# Altium footprint library 04.连接器件.pcb.PCBLIB: 363 footprints (part 11 of 23)
Each footprint in its own frame and in the unit in brackets; x right, y up, seen from the top. Pads: shape width x height; smd on the part's side, far side on the other; paste and mask are expansions set on the pad; w line width, h text height; cw(c..) or ccw(c..) is an arc to the next point about the centre after c.
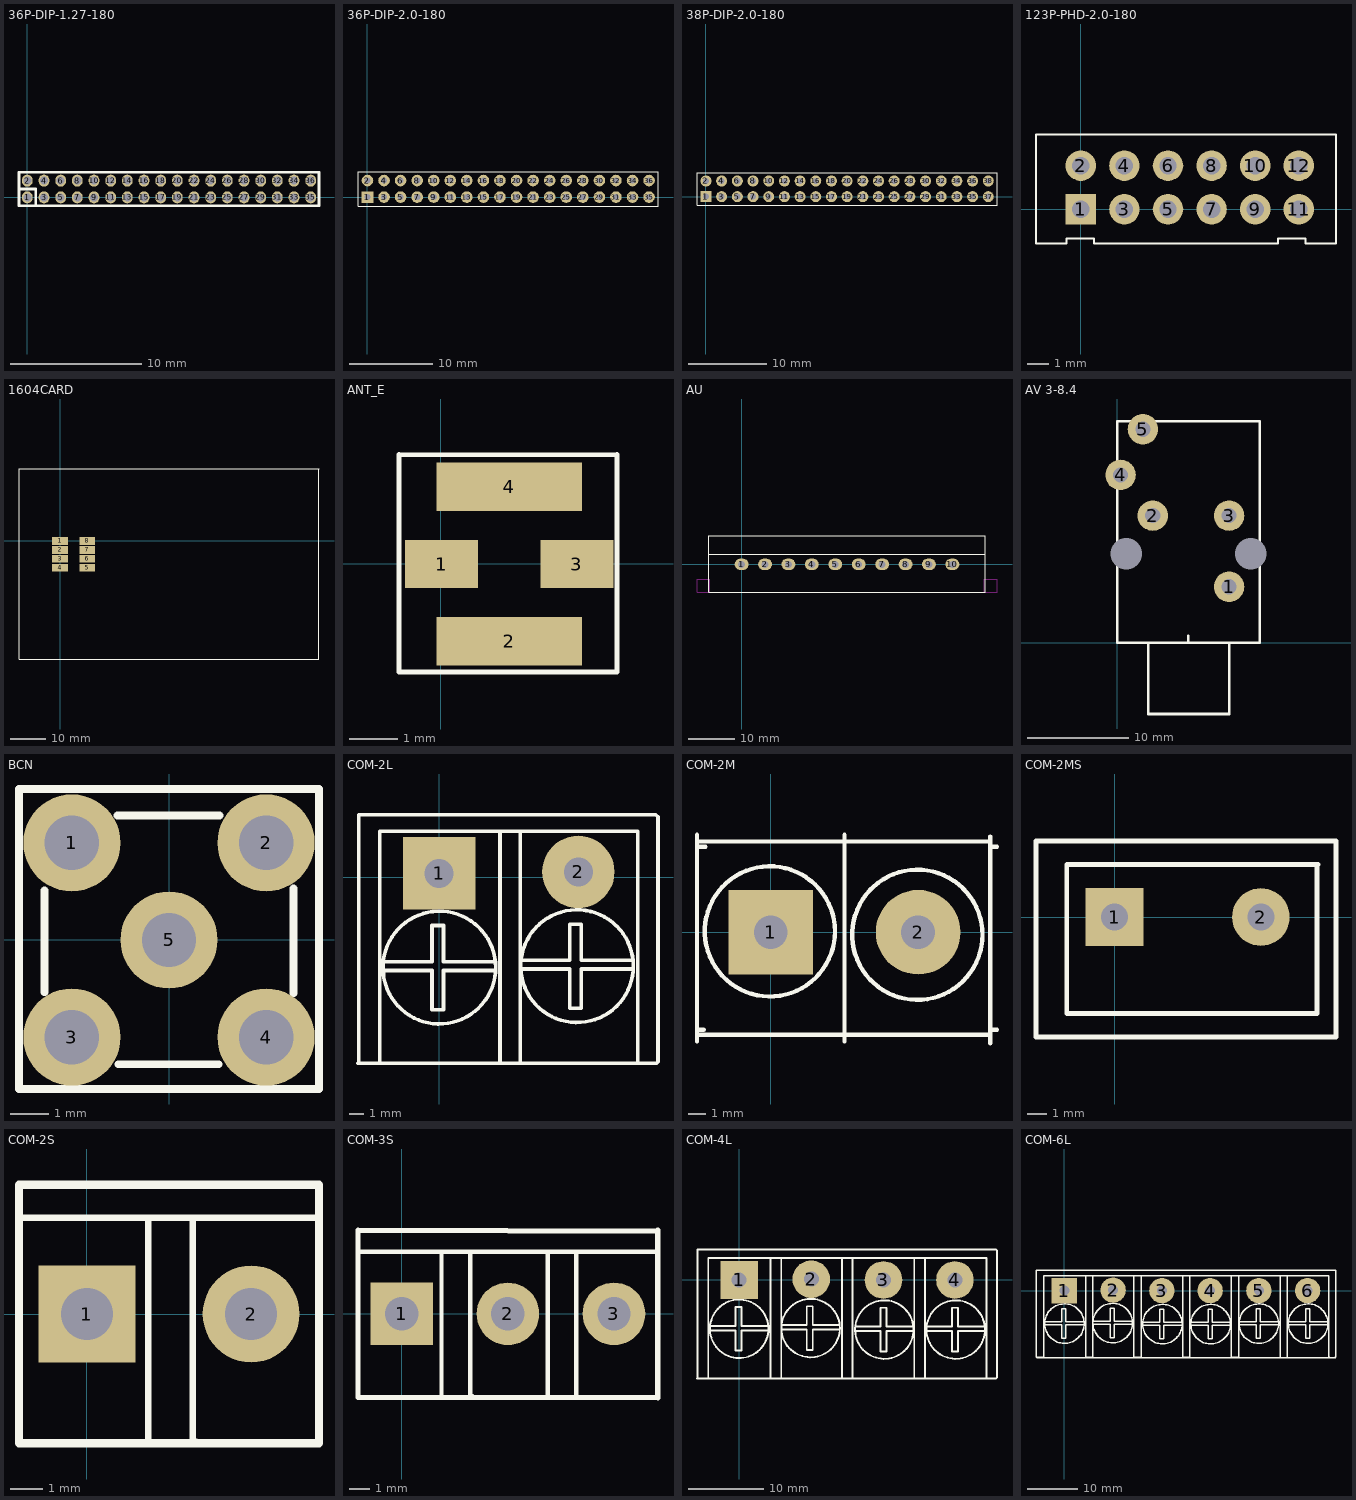
[diagram p10: the footprints below, top view; thin cyan lines are the x and y axes]

## 36P-DIP-1.27-180 [mil]
pads (36):
  oval 32x36 hole 24: 1(0,0) 2(0,50) 3(50,0) 4(50,50) 5(100,0) 6(100,50) 7(150,0) 8(150,50) 9(200,0) 10(200,50) 11(250,0) 12(250,50) 13(300,0) 14(300,50) 15(350,0) 16(350,50) 17(400,0) 18(400,50) 19(450,0) 20(450,50) 21(500,0) 22(500,50) 23(550,0) 24(550,50) 25(600,0) 26(600,50) 27(650,0) 28(650,50) 29(700,0) 30(700,50) 31(750,0) 32(750,50) 33(800,0) 34(800,50) 35(850,0) 36(850,50)
TopOverlay:
  lines w8: -25,25 25,25 25,-25 ; -25,-25 875,-25 875,75 -25,75 -25,-25

## 36P-DIP-2.0-180 [mm]
pads (36):
  rect 1.4x1.4 hole 0.75: 1(0,0)
  round 1.4 hole 0.75: 2(0,2) 3(2,0) 4(2,2) 5(4,0) 6(4,2) 7(6,0) 8(6,2) 9(8,0) 10(8,2) 11(10,0) 12(10,2) 13(12,0) 14(12,2) 15(14,0) 16(14,2) 17(16,0) 18(16,2) 19(18,0) 20(18,2) 21(20,0) 22(20,2) 23(22,0) 24(22,2) 25(24,0) 26(24,2) 27(26,0) 28(26,2) 29(28,0) 30(28,2) 31(30,0) 32(30,2) 33(32,0) 34(32,2) 35(34,0) 36(34,2)
TopOverlay:
  lines w0.1: -1.143,-1.118 -1.143,3.073 35.077,3.073 35.077,-1.118 -1.143,-1.118
3D body "DIP36(2.0)排针.": height 8, standoff -2.6, extent -1.041,-1.092 34.959,2.908

## 38P-DIP-2.0-180 [mm]
pads (38):
  rect 1.4x1.4 hole 0.75: 1(0,0)
  round 1.4 hole 0.75: 2(0,2) 3(2,0) 4(2,2) 5(4,0) 6(4,2) 7(6,0) 8(6,2) 9(8,0) 10(8,2) 11(10,0) 12(10,2) 13(12,0) 14(12,2) 15(14,0) 16(14,2) 17(16,0) 18(16,2) 19(18,0) 20(18,2) 21(20,0) 22(20,2) 23(22,0) 24(22,2) 25(24,0) 26(24,2) 27(26,0) 28(26,2) 29(28,0) 30(28,2) 31(30,0) 32(30,2) 33(32,0) 34(32,2) 35(34,0) 36(34,2) 37(36,0) 38(36,2)
TopOverlay:
  lines w0.1: -1.143,-1.118 -1.143,3.073 37.109,3.073 37.109,-1.118 -1.143,-1.118
3D body "DIP38(2.0)排针.": height 8, standoff -2.6, extent -1.041,-0.991 36.959,3.009

## 123P-PHD-2.0-180 [mm]
pads (12):
  rect 1.4x1.4 hole 0.8: 1(0,0)
  round 1.4 hole 0.8: 2(0,2) 3(2,0) 4(2,2) 5(4,0) 6(4,2) 7(6,0) 8(6,2) 9(8,0) 10(8,2) 11(10,0) 12(10,2)
TopOverlay:
  lines w0.1: -2.057,-1.575 -0.66,-1.575 -0.66,-1.346 0.61,-1.346 0.61,-1.575 9.042,-1.575 9.042,-1.346 10.312,-1.346 10.312,-1.575 11.709,-1.575 11.709,3.43 -2.057,3.425 -2.057,-1.575
3D body "IDC12(2.0).STEP": height 6.5, standoff -2.6, extent -2.184,-1.626 11.816,3.374

## 1604CARD [mm]
pads (8):
  rect 4.5x2.2 smd: 1(0,0) 2(0,-2.54) 3(0,-5.08) 4(0,-7.62) 5(7.7,-7.62) 6(7.7,-5.08) 7(7.7,-2.54) 8(7.7,0)
TopOverlay:
  lines w0.254: -11.65,-13.208 -11.65,20.32 -11.51,20.46 -6.016,20.46 12.78,20.46 73.21,20.46 73.35,20.32 73.35,-33.528 73.338,-33.54 23.448,-33.54 -11.604,-33.54 -11.65,-33.494 -11.65,-12.7

## ANT_E [mm]
pads (4):
  rect 1.5x1 smd: 1(0.012,-0.003) 3(2.812,-0.003)
  rect 3x1 smd: 2(1.412,-1.603) 4(1.412,1.597)
TopOverlay:
  lines w0.1: -0.864,-2.239 -0.864,2.261 ; -0.864,-2.235 3.636,-2.235 ; -0.864,2.256 3.636,2.256 ; 3.636,-2.239 3.636,2.261

## AU [mm] "卡式音频输入"
pads (10):
  oval 3x2.5 hole 1.5: 1(0,0) 2(5.08,0) 3(10.16,0) 4(15.24,0) 5(20.32,0) 6(25.4,0) 7(30.48,0) 8(35.56,0) 9(40.64,0) 10(45.72,0)
TopOverlay:
  lines w0.254: -7.134,2.134 52.866,2.134 ; -7.134,-6.016 52.866,-6.016 52.866,6.184 -7.134,6.184 -7.134,-6.016
KeepOutLayer:
  lines w0.254: -9.677,-6.042 -9.677,-3.248 -6.883,-3.248 -6.883,-6.042 -9.677,-6.042 ; 52.603,-6.016 52.603,-3.222 55.397,-3.222 55.397,-6.016 52.603,-6.016

## AV 3-8.4 [mm]
pads (7):
  round 3 hole 1.5: 1(11,5.5) 2(3.5,12.5) 3(11,12.5) 4(0.325,16.5) 5(2.525,21)
  round 3 hole 3.1 unplated: ""(0.9,8.75) ""(13.15,8.75)
TopOverlay:
  lines w0.254: 3.04,0 3.04,-7.02 11.02,-7.02 11.02,0 ; 7,0 7,0.66 ; 0,0 0,21.8 14,21.8 14,0 0,0
3D body "User Library-Mouser_161-4320.STEP": height 40.92, standoff -4.32, extent 0.3,-8.208 17.115,23.008

## BCN [mm]
pads (5):
  round 2.5 hole 1.4: 1(-2.5,2.5) 2(2.5,2.5) 3(-2.5,-2.5) 4(2.5,-2.5) 5(0,0)
TopOverlay:
  lines w0.203: -3.2,-1.346 -3.2,1.27 ; -1.321,3.2 1.295,3.2 ; -1.295,-3.2 1.27,-3.2 ; 3.2,-1.372 3.2,1.321 ; -3.861,-3.835 3.861,-3.835 3.861,3.886 -3.861,3.886 -3.861,-3.835

## COM-2L [mm]
pads (2):
  rect 5x5 hole 2: 1(0,0.25)
  round 5 hole 2: 2(9.6,0.35)
TopOverlay:
  circle w0.254: c9.51,-6.15 r3.89
  circle w0.254: c0.01,-6.25 r3.89
  lines w0.254: -5.5,-12.85 15,-12.85 ; -4.1,-8.25 -4.1,-12.85 ; -3.8,-6.45 -0.5,-6.45 -0.5,-8.15 -0.5,-9.15 0.3,-9.15 0.3,-8.15 0.3,-6.45 3.8,-6.45 ; -3.8,-5.85 -0.5,-5.85 -0.5,-4.15 -0.5,-3.55 -0.5,-3.35 0.3,-3.35 0.3,-4.75 ; 0.3,-4.15 0.3,-5.85 3.8,-5.85 ; 4.2,3.15 4.2,-12.75 4.3,-12.85 5.5,-12.85 5.6,-12.75 5.6,3.15 ; 5,3.15 13.7,3.15 13.7,-12.75 13.8,-12.85 15,-12.85 ; 5.5,3.15 -4.1,3.15 -4.1,-12.75 -4.1,-12.85 ; 5.7,-6.35 9,-6.35 9,-8.05 9,-9.05 9.8,-9.05 9.8,-8.05 9.8,-6.35 13.3,-6.35 ; 5.7,-5.75 9,-5.75 9,-4.05 9,-3.45 9,-3.25 9.8,-3.25 9.8,-4.65 ; 9.8,-4.05 9.8,-5.75 13.3,-5.75 ; -4.1,-12.85 -5.6,-12.85 -5.547,-12.797 -5.547,4.297 14.953,4.297 15.1,4.15 15.1,3.15 15.1,-12.75 15,-12.85

## COM-2M [mm]
pads (2):
  rect 5x5 hole 2: 1(0,0)
  round 5 hole 2: 2(8.7,0)
TopOverlay:
  circle w0.254: c8.65,-0.15 r3.842
  circle w0.254: c-0.05,0.05 r3.842
  lines w0.254: -4.35,-6.45 -4.35,5.75 ; -4.35,-6.05 12.95,-6.05 ; -4.35,5.35 12.95,5.35 ; -4.25,-5.75 -3.95,-5.75 ; -4.25,5.05 -3.85,5.05 ; 4.35,-6.45 4.35,5.75 ; 12.95,-6.55 12.95,5.65 ; 12.95,5.05 13.35,5.05 ; 13.05,-5.75 13.35,-5.75

## COM-2MS [mm]
pads (2):
  rect 3x3 hole 1.4: 1(0,0)
  round 3 hole 1.4: 2(7.62,0)
TopOverlay:
  lines w0.254: 10.541,2.692 10.541,-5.029 -2.489,-5.029 -2.489,2.743 10.592,2.743 ; -4.088,-6.248 11.532,-6.248 11.532,3.962 -4.088,3.962 -4.088,-6.248

## COM-2S [mm]
pads (2):
  rect 3x3 hole 1.6: 1(0,0)
  round 3 hole 1.6: 2(5.08,0)
TopOverlay:
  lines w0.2: -2.1,2.972 7.155,2.972 7.18,2.946 ; 1.854,-4 1.905,-3.949 1.905,2.972 ; 3.277,-4 3.277,2.921 ; 3.378,-3.949 3.429,-4
  lines w0.254: 7.09,-4 -2.1,-4 -2.1,4 7.09,4 ; 7.18,-4 7.18,4

## COM-3S [mm]
pads (3):
  rect 3x3 hole 1.6: 1(0,0)
  round 3 hole 1.6: 2(5.08,0) 3(10.16,0)
TopOverlay:
  lines w0.2: -2.1,2.972 12.268,2.972 ; 1.854,-4 1.905,-3.949 1.905,2.972 ; 3.277,-4 3.277,2.921 ; 3.378,-3.949 3.429,-4 ; 6.985,-3.949 6.985,2.972 ; 8.357,-4 8.357,2.921
  lines w0.254: 12.243,3.962 -2.1,4 -2.1,-4 12.268,-4.013 ; 12.26,-4 12.26,4

## COM-4L [mm]
pads (4):
  rect 5x5 hole 2: 1(0,0)
  round 5 hole 2: 2(9.6,0.1) 3(19.2,0) 4(28.7,0)
TopOverlay:
  circle w0.254: c28.81,-6.6 r3.89
  circle w0.254: c19.31,-6.6 r3.89
  circle w0.254: c9.51,-6.4 r3.89
  circle w0.254: c0.01,-6.5 r3.89
  lines w0.254: -4.1,-8.5 -4.1,-13.1 ; -3.8,-6.7 -0.5,-6.7 -0.5,-8.4 -0.5,-9.4 0.3,-9.4 0.3,-8.4 0.3,-6.7 3.8,-6.7 ; -3.8,-6.1 -0.5,-6.1 -0.5,-4.4 -0.5,-3.8 -0.5,-3.6 0.3,-3.6 0.3,-5 ; 0.3,-4.4 0.3,-6.1 3.8,-6.1 ; 4.2,2.9 4.2,-13 4.3,-13.1 5.5,-13.1 5.6,-13 5.6,2.9 ; 4.9,2.9 14.4,2.9 32.9,2.9 32.9,-13 33,-13.1 34.2,-13.1 ; 5.5,2.9 -4.1,2.9 -4.1,-13 -4.1,-13.1 ; 5.7,-6.6 9,-6.6 9,-8.3 9,-9.3 9.8,-9.3 9.8,-8.3 9.8,-6.6 13.3,-6.6 ; 5.7,-6 9,-6 9,-4.3 9,-3.7 9,-3.5 9.8,-3.5 9.8,-4.9 ; 9.8,-4.3 9.8,-6 13.3,-6 ; 13.7,2.9 13.7,-13 13.8,-13.1 15,-13.1 15.1,-13 15.1,2.9 ; 15.5,-6.8 18.8,-6.8 18.8,-8.5 18.8,-9.5 19.6,-9.5 19.6,-8.5 19.6,-6.8 23.1,-6.8 ; 15.5,-6.2 18.8,-6.2 18.8,-4.5 18.8,-3.9 18.8,-3.7 19.6,-3.7 19.6,-5.1 ; 19.6,-4.5 19.6,-6.2 23.1,-6.2 ; 23.3,2.9 23.3,-13 23.4,-13.1 24.6,-13.1 24.7,-13 24.7,2.9 ; 25,-6.8 28.3,-6.8 28.3,-8.5 28.3,-9.5 29.1,-9.5 29.1,-8.5 29.1,-6.8 32.6,-6.8 ; 25,-6.2 28.3,-6.2 28.3,-4.5 28.3,-3.9 28.3,-3.7 29.1,-3.7 29.1,-5.1 ; 29.1,-4.5 29.1,-6.2 32.6,-6.2 ; -5.6,-13.1 34.2,-13.1 ; -5.6,-13.1 -5.547,-13.047 -5.547,4.047 34.203,4.047 34.3,3.95 34.3,2.9 34.3,-13 ; -5.6,-13.1 -4.1,-13.1 ; 34.2,-13.1 34.3,-13 ; 34.2,-13.1 34.3,-13

## COM-6L [mm]
pads (6):
  rect 5x5 hole 2: 1(0,0)
  round 5 hole 2: 2(9.6,0.1) 3(19.2,0) 4(28.7,0) 5(38.3,0) 6(47.9,0)
TopOverlay:
  circle w0.254: c48.01,-6.5 r3.89
  circle w0.254: c38.31,-6.5 r3.89
  circle w0.254: c28.81,-6.6 r3.89
  circle w0.254: c19.31,-6.6 r3.89
  circle w0.254: c9.51,-6.4 r3.89
  circle w0.254: c0.01,-6.5 r3.89
  lines w0.254: -5.5,-13.25 53.5,-13.25 ; -4.1,-8.5 -4.1,-13.1 ; -3.8,-6.7 -0.5,-6.7 -0.5,-8.4 -0.5,-9.4 0.3,-9.4 0.3,-8.4 0.3,-6.7 3.8,-6.7 ; -3.8,-6.1 -0.5,-6.1 -0.5,-4.4 -0.5,-3.8 -0.5,-3.6 0.3,-3.6 0.3,-5 ; 0.3,-4.4 0.3,-6.1 3.8,-6.1 ; 4.2,2.9 4.2,-13 4.3,-13.1 5.5,-13.1 5.6,-13 5.6,2.9 52.1,2.9 52.1,-13 52.2,-13.1 ; 4.9,2.9 14.4,2.9 ; 5.5,2.9 -4.1,2.9 -4.1,-13 -4.1,-13.1 ; 5.7,-6.6 9,-6.6 9,-8.3 9,-9.3 9.8,-9.3 9.8,-8.3 9.8,-6.6 13.3,-6.6 ; 5.7,-6 9,-6 9,-4.3 9,-3.7 9,-3.5 9.8,-3.5 9.8,-4.9 ; 9.8,-4.3 9.8,-6 13.3,-6 ; 13.7,2.9 13.7,-13 13.8,-13.1 15,-13.1 15.1,-13 15.1,2.9 ; 15.5,-6.8 18.8,-6.8 18.8,-8.5 18.8,-9.5 19.6,-9.5 19.6,-8.5 19.6,-6.8 23.1,-6.8 ; 15.5,-6.2 18.8,-6.2 18.8,-4.5 18.8,-3.9 18.8,-3.7 19.6,-3.7 19.6,-5.1 ; 19.6,-4.5 19.6,-6.2 23.1,-6.2 ; 23.3,2.9 23.3,-13 23.4,-13.1 24.6,-13.1 24.7,-13 24.7,2.9 ; 25,-6.8 28.3,-6.8 28.3,-8.5 28.3,-9.5 29.1,-9.5 29.1,-8.5 29.1,-6.8 32.6,-6.8 ; 25,-6.2 28.3,-6.2 28.3,-4.5 28.3,-3.9 28.3,-3.7 29.1,-3.7 29.1,-5.1 ; 29.1,-4.5 29.1,-6.2 32.6,-6.2 ; 32.9,2.9 32.9,-13 33,-13.1 34.2,-13.1 34.3,-13 34.3,2.9 ; 34.5,-6.7 37.8,-6.7 37.8,-8.4 37.8,-9.4 38.6,-9.4 38.6,-8.4 38.6,-6.7 42.1,-6.7 ; 34.5,-6.1 37.8,-6.1 37.8,-4.4 37.8,-3.8 37.8,-3.6 38.6,-3.6 38.6,-5 ; 38.6,-4.4 38.6,-6.1 42.1,-6.1 ; 42.5,2.8 42.5,-13.1 42.6,-13.2 ; 43.8,-13.2 43.9,-13.1 43.9,2.8 ; 44.2,-6.7 47.5,-6.7 47.5,-8.4 47.5,-9.4 48.3,-9.4 48.3,-8.4 48.3,-6.7 51.8,-6.7 ; 44.2,-6.1 47.5,-6.1 47.5,-4.4 47.5,-3.8 47.5,-3.6 48.3,-3.6 48.3,-5 ; 48.3,-4.4 48.3,-6.1 51.8,-6.1 ; 53.5,2.5 53.5,4 53.453,4.047 -5.547,4.047 -5.547,-13.047 -5.6,-13.1 -4.1,-13.1 ; 53.5,2.9 53.5,-13 ; 53.5,-13 53.4,-13.1 53.5,-13